# Altium footprint library Connectors.PcbLib: 133 footprints (part 4 of 9)
Each footprint in its own frame and in the unit in brackets; x right, y up, seen from the top. Pads: shape width x height; smd on the part's side, far side on the other; paste and mask are expansions set on the pad; w line width, h text height; cw(c..) or ccw(c..) is an arc to the next point about the centre after c.
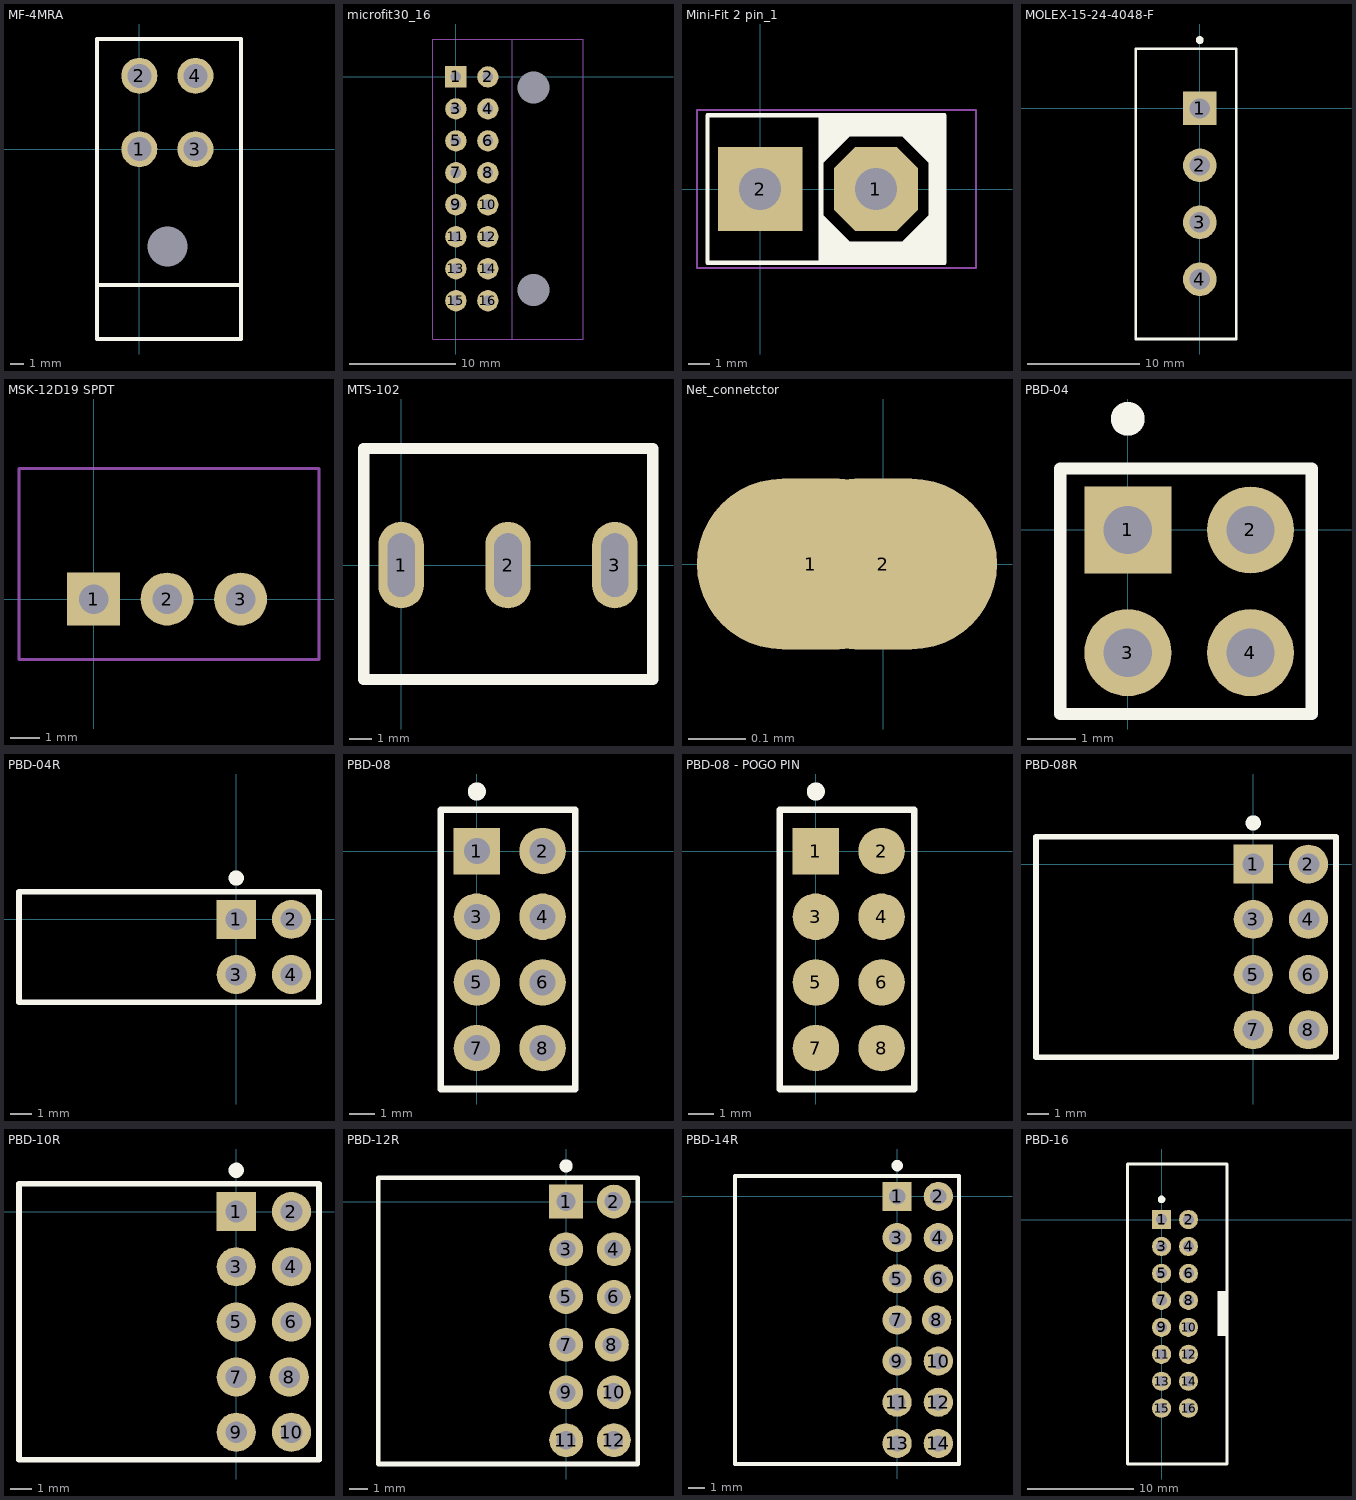
[diagram p3: the footprints below, top view; thin cyan lines are the x and y axes]

## MF-4MRA [mm] "MINI-FIT питание. 8А макс"
pads (5):
  round 2.7 hole 1.8: 1(0,0) 2(0,5.5) 3(4.2,0) 4(4.2,5.5)
  round 0 hole 3 unplated mask+1.55: NPTH(2.1,-7.3)
Top Overlay:
  lines w0.3: -3.175,-10.16 7.62,-10.16 ; -3.175,-14.224 -3.175,8.255 7.62,8.255 7.62,-14.224 -3.175,-14.224
3D body "Mini-Fit 4pin (MF-4MRA).STEP": height 11.7, standoff -3.3, extent -2.781,-13.995 7.218,5.94

## microfit30_16 [mm]
pads (18):
  round 0 hole 3 unplated: 0(7.29,-19.99) 0(7.29,-1.016)
  rect 2x2 hole 1: 1(0,0)
  round 2 hole 1: 2(3,0) 3(0,-3) 4(3,-3) 5(0,-6) 6(3,-6) 7(0,-9) 8(3,-9) 9(0,-12) 10(3,-12) 11(0,-15) 12(3,-15) 13(0,-18) 14(3,-18) 15(0,-21) 16(3,-21)
Mechanical 29:
  lines w0.1: 4.826,3.556 5.283,3.556 5.283,-24.594 5.817,-24.594 ; -2.159,-24.594 -2.159,3.556 11.937,3.556 11.937,-24.594 -2.159,-24.594
  text ".Designator" at 9.703,-0.127 h1.5
3D body "header-16 R PCB.stp": height 8.83, standoff -3.12, extent -0.303,-24.594 11.937,3.556

## Mini-Fit 2 pin_1 [mm] "вилка на плату прямая"
pads (2):
  oct 4x4 hole 2: 1(5.5,0)
  rect 4x4 hole 2: 2(0,0)
Top Overlay:
  region: 3,-3.375 3,3.5 2.875,3.5 2.875,-3.375
  region: 8.75,-3.25 8.75,2.5 8,2.5 8,-3.25
  rectangle: 3,-3.5 8.75,-2.5
  rectangle: 3,2.5 8.75,3.5
  region: 8,-1.25 8,-2.75 7,-2.75 6.75,-2.5
  region: 4.25,-2.5 2.875,-3.5 3,-1.25
  region: 3,1.25 3,2.75 4,2.75 4.25,2.5
  region: 6.75,2.5 8.25,2.5 8.25,1.5 8,1.25
  lines w0.2: 2.875,-3.5 2.875,3.5 ; -2.5,-3.5 -2.5,3.5 8.75,3.5 8.75,-3.5 -2.5,-3.5
Mechanical 15:
  lines w0.1: -3,-3.75 10.25,-3.75 10.25,3.75 -3,3.75 -3,-3.75
3D body "Mini-Fit 2.stp": height 12.8, standoff -3.5, extent -2.25,-3 8.75,3.2

## MOLEX-15-24-4048-F [mm]
pads (4):
  rect 3x3 hole 1.8: 1(0,0)
  round 3 hole 1.8: 2(0,-5.08) 3(0,-10.16) 4(0,-15.24)
Top Overlay:
  circle w0.5: c0,6.096 r0.1
  lines w0.254: -5.715,-20.574 -5.715,5.33 3.25,5.33 3.25,-20.574 -5.715,-20.574
3D body "MOLEX-15-24-4048-F.STEP": height 22.29, standoff -5.79, extent -5.715,-20.57 3.175,5.33

## MSK-12D19 SPDT [mm]
pads (3):
  rect 1.8x1.8 hole 1: 1(0,0)
  round 1.8 hole 1: 2(2.5,0) 3(5,0)
Mechanical 29:
  lines w0.1: -2.535,-2.057 7.665,-2.057 7.665,4.444 -2.535,4.444 -2.535,-2.057
  text ".Designator" at 0.5,2 h1
3D body "slide switch spd 3 pin.stp": height 3.65, standoff -4.4, extent -2.535,-2.057 7.665,4.444

## MTS-102 [mm]
height 10
pads (3):
  oval 2x3.8 hole 1.2 slot 2.8 at 90 deg: 1(0,0) 2(4.7,0) 3(9.4,0)
Top Overlay:
  lines w0.5: -1.651,-5.029 -1.651,5.131 11.063,5.131 11.063,-5.029 -1.651,-5.029
3D body "toogle_switch.STEP": height 28.55, standoff -3.83, extent -1.651,-5.029 11.063,5.131

## Net_connetctor [mm] "Связывает 2 net.  нужно для формулы. Удобство разводки"
pads (2):
  oval 0.4x0.3 smd: 1(-0.127,0) 2(0,0)

## PBD-04 [mm]
pads (4):
  rect 1.8x1.8 hole 1: 1(0,0)
  round 1.8 hole 1: 2(2.54,0) 3(0,-2.54) 4(2.54,-2.54)
Top Overlay:
  circle w0.5: c0,2.3 r0.1
  lines w0.254: -1.4,-3.81 3.81,-3.81 3.81,1.27 -1.4,1.27 -1.4,-3.81
3D body "PBD2-2(2.54mm).STEP": height 8.4, standoff -2.7, extent -1.24,-3.81 3.84,1.27

## PBD-04R [mm]
pads (4):
  rect 1.8x1.8 hole 1: 1(0,0)
  round 1.8 hole 1: 2(2.54,0) 3(0,-2.54) 4(2.54,-2.54)
Top Overlay:
  circle w0.5: c0,1.9 r0.1
  lines w0.254: -10,-3.81 3.81,-3.81 3.81,1.27 -10,1.27 -10,-3.81
3D body "PBD-04R.step": height 5, standoff -3, extent -10,-3.81 3,1.27

## PBD-08 [mm]
pads (8):
  rect 1.8x1.8 hole 1: 1(0,0)
  round 1.8 hole 1: 2(2.54,0) 3(0,-2.54) 4(2.54,-2.54) 5(0,-5.08) 6(2.54,-5.08) 7(0,-7.62) 8(2.54,-7.62)
Top Overlay:
  circle w0.5: c0,2.3 r0.1
  lines w0.254: -1.4,-9.2 3.81,-9.2 3.81,1.6 -1.4,1.6 -1.4,-9.2
Mechanical 29:
  lines w0.1: -1.4,-9.2 -1.4,1.6 3.81,1.6 3.81,-9.2 -1.4,-9.2
  text ".Designator" at -0.7,3.1 h2
3D body "PBD2-2(2.54mm).STEP": height 8.4, standoff -2.7, extent -1.24,-3.81 3.84,1.27
3D body "PBD2-2(2.54mm).STEP": height 8.4, standoff -2.7, extent -1.24,-8.89 3.84,-3.81

## PBD-08 - POGO PIN [mm]
pads (8):
  rect 1.8x1.8 smd: 1(0,0)
  round 1.8 smd: 2(2.54,0) 3(0,-2.54) 4(2.54,-2.54) 5(0,-5.08) 6(2.54,-5.08) 7(0,-7.62) 8(2.54,-7.62)
Top Overlay:
  circle w0.5: c0,2.3 r0.1
  lines w0.254: -1.4,-9.2 3.81,-9.2 3.81,1.6 -1.4,1.6 -1.4,-9.2
Mechanical 29:
  lines w0.1: -1.4,-9.2 -1.4,1.6 3.81,1.6 3.81,-9.2 -1.4,-9.2
  text ".Designator" at -0.7,3.1 h2

## PBD-08R [mm]
pads (8):
  rect 1.8x1.8 hole 1: 1(0,0)
  round 1.8 hole 1: 2(2.54,0) 3(0,-2.54) 4(2.54,-2.54) 5(0,-5.08) 6(2.54,-5.08) 7(0,-7.62) 8(2.54,-7.62)
Top Overlay:
  circle w0.5: c0,1.9 r0.1
  lines w0.254: -10,-8.89 -10,1.27 3.81,1.27 3.81,-8.89 -10,-8.89
3D body "PBD-04R.step": height 5, standoff -3, extent -10,-8.89 3,-3.81
3D body "PBD-04R.step": height 5, standoff -3, extent -10,-3.81 3,1.27

## PBD-10R [mm]
pads (10):
  rect 1.8x1.8 hole 1: 1(0,0)
  round 1.8 hole 1: 2(2.54,0) 3(0,-2.54) 4(2.54,-2.54) 5(0,-5.08) 6(2.54,-5.08) 7(0,-7.62) 8(2.44,-7.62) 9(0,-10.16) 10(2.54,-10.16)
Top Overlay:
  circle w0.5: c0,1.9 r0.1
  lines w0.254: -10,-11.43 3.81,-11.43 3.81,1.27 -10,1.27 -10,-11.43
3D body "PBD-04R.step": height 5, standoff -3, extent -10,-3.81 3,1.27
3D body "PBD-04R.step": height 5, standoff -3, extent -10,-8.89 3,-3.81
3D body "PBD-04R.step": height 5, standoff -3, extent -10,-11.43 3,-6.35

## PBD-12R [mm]
pads (12):
  rect 1.8x1.8 hole 1: 1(0,0)
  round 1.8 hole 1: 2(2.54,0) 3(0,-2.54) 4(2.54,-2.54) 5(0,-5.08) 6(2.54,-5.08) 7(0,-7.62) 8(2.44,-7.62) 9(0,-10.16) 10(2.54,-10.16) 11(0,-12.7) 12(2.54,-12.7)
Top Overlay:
  circle w0.5: c0,1.9 r0.1
  lines w0.254: -10,-13.97 -10,1.27 3.81,1.27 3.81,-13.97 -10,-13.97
3D body "PBD-04R.step": height 5, standoff -3, extent -10,-13.97 3,-8.89
3D body "PBD-04R.step": height 5, standoff -3, extent -10,-8.89 3,-3.81
3D body "PBD-04R.step": height 5, standoff -3, extent -10,-3.81 3,1.27

## PBD-14R [mm]
pads (14):
  rect 1.8x1.8 hole 1: 1(0,0)
  round 1.8 hole 1: 2(2.54,0) 3(0,-2.54) 4(2.54,-2.54) 5(0,-5.08) 6(2.54,-5.08) 7(0,-7.62) 8(2.44,-7.62) 9(0,-10.16) 10(2.54,-10.16) 11(0,-12.7) 12(2.54,-12.7) 13(0,-15.24) 14(2.54,-15.24)
Top Overlay:
  circle w0.5: c0,1.9 r0.1
  lines w0.254: -10,-16.51 3.81,-16.51 3.81,1.27 -10,1.27 -10,-16.51
3D body "PBD-04R.step": height 5, standoff -3, extent -10,-16.51 3,-11.43
3D body "PBD-04R.step": height 5, standoff -3, extent -10,-3.81 3,1.27
3D body "PBD-04R.step": height 5, standoff -3, extent -10,-8.89 3,-3.81
3D body "PBD-04R.step": height 5, standoff -3, extent -10,-13.97 3,-8.89

## PBD-16 [mm]
pads (16):
  rect 1.8x1.8 hole 1: 1(0,0)
  round 1.8 hole 1: 2(2.54,0) 3(0,-2.54) 4(2.54,-2.54) 5(0,-5.08) 6(2.54,-5.08) 7(0,-7.62) 8(2.54,-7.62) 9(0,-10.16) 10(2.54,-10.16) 11(0,-12.7) 12(2.54,-12.7) 13(0,-15.24) 14(2.54,-15.24) 15(0,-17.78) 16(2.54,-17.78)
Top Overlay:
  circle w0.5: c0,1.9 r0.1
  region: 6.117,-10.984 6.117,-6.734 5.25,-6.734 5.25,-10.984
  lines w0.254: -3.2,-23.038 6.172,-23.038 6.172,5.232 -3.2,5.232 -3.2,-23.038
3D body "User Library-User Library-IDC-16M.STEP": height 9.3, standoff -3.1, extent -3.43,-22.89 5.67,5.11